# Altium footprint library 2.52-直插元件.PcbLib: 163 footprints (part 6 of 11)
Each footprint in its own frame and in the unit in brackets; x right, y up, seen from the top. Pads: shape width x height; smd on the part's side, far side on the other; paste and mask are expansions set on the pad; w line width, h text height; cw(c..) or ccw(c..) is an arc to the next point about the centre after c.
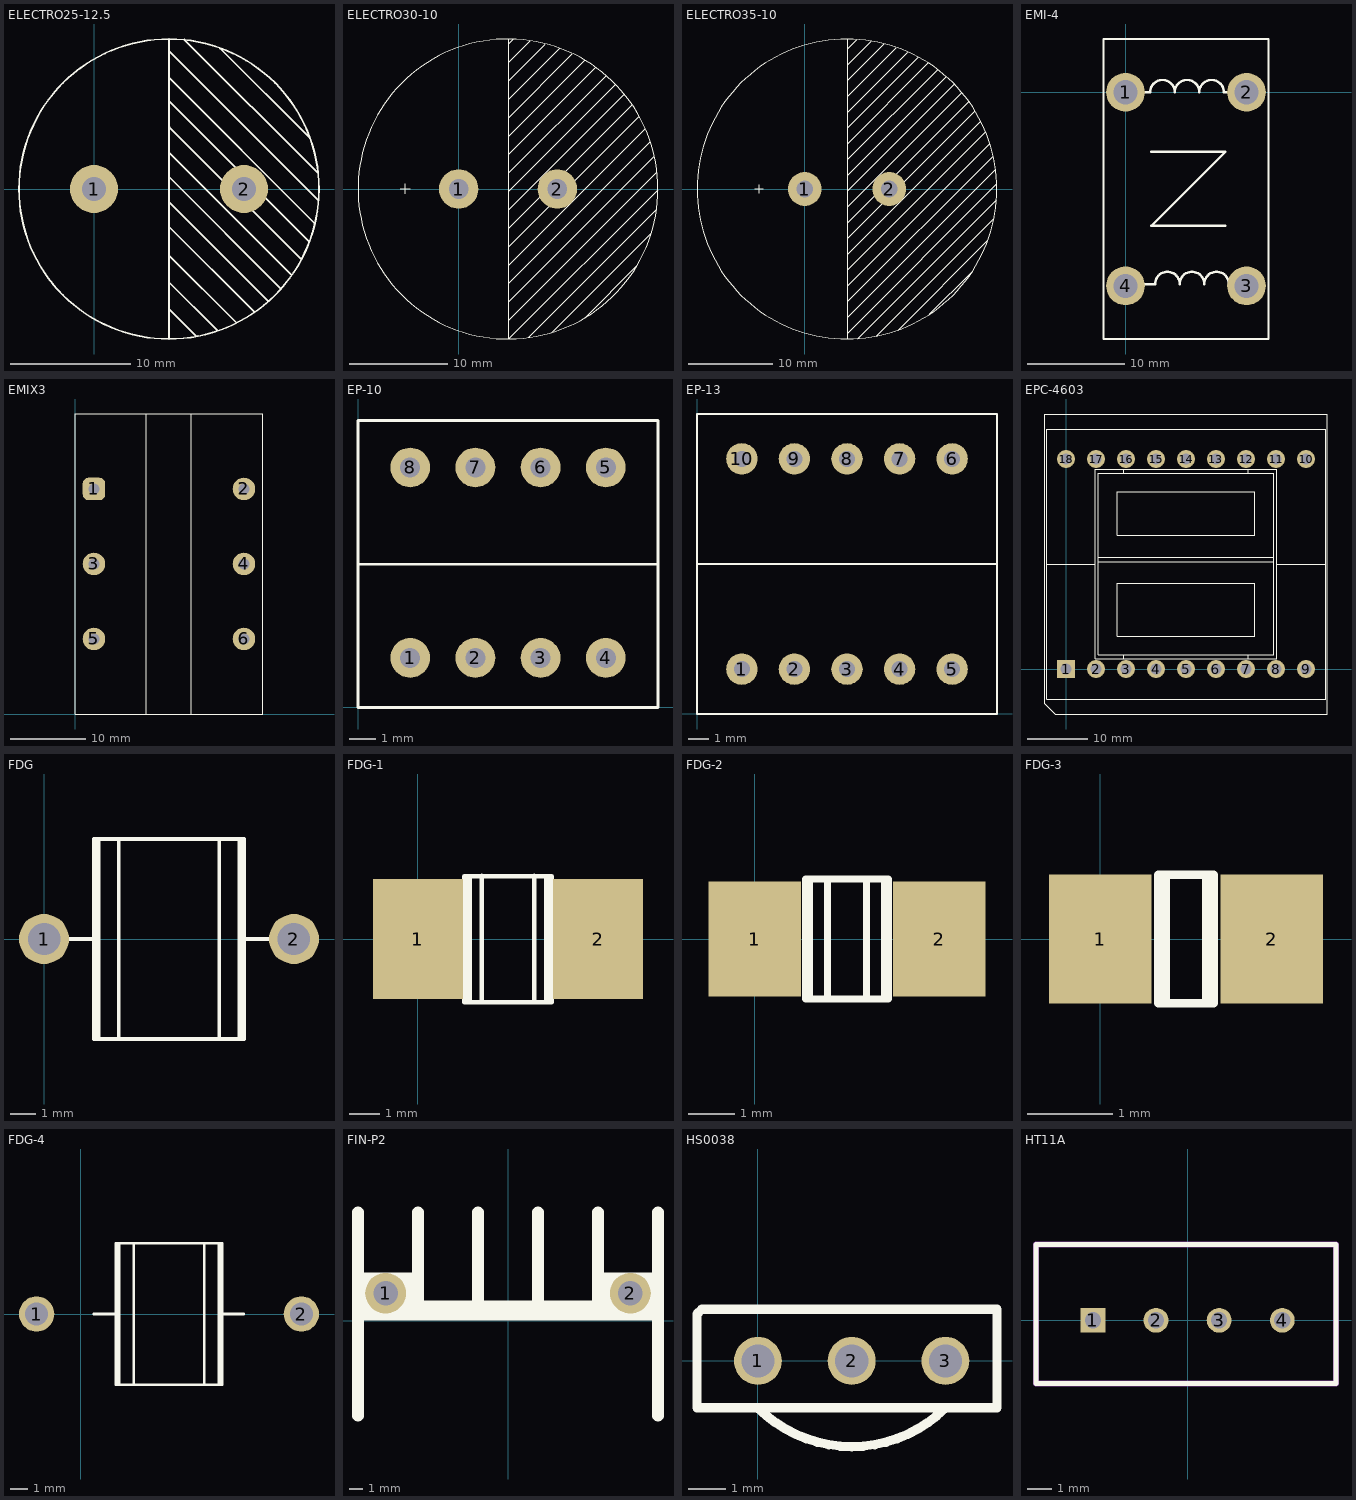
[diagram p5: the footprints below, top view; thin cyan lines are the x and y axes]

## ELECTRO25-12.5 [mm] "淘宝ID:黄晶宝石   店铺网址:https://shop463601444.taobao.com"
pads (2):
  round 4 hole 2: 1(0,0) 2(12.5,0)
Top Overlay:
  lines w0.15: 6.224,-1.075 14.513,-9.364 ; 6.236,-3.122 13.301,-10.187 ; 6.238,-7.75 10.3,-11.812 ; 6.25,-12.5 6.25,12.5 ; 6.25,1.01 15.556,-8.297 ; 6.256,7.302 17.939,-4.38 ; 6.26,9.255 18.387,-2.872 ; 6.263,11.487 18.7,-0.95 ; 6.266,-10.012 8.494,-12.241 ; 6.268,3.025 16.391,-7.097 ; 6.276,-5.555 11.831,-11.109 ; 6.284,5.161 17.241,-5.796 ; 7.531,12.453 18.678,1.306 ; 10.501,11.719 18.005,4.214 ; 18.75,-0.013 cw(c6.25,0) 18.75,0
3D body "User Library-Cap 25x50.STEP": height 50.05, standoff -18.95, extent -6.25,-12.5 18.75,12.5

## ELECTRO30-10 [mm]
pads (2):
  round 4 hole 2: 1(0,0) 2(10,0)
Top Overlay:
  circle w0.1: c5,0 r15.2
  lines w0.1: -5.909,0.011 -4.893,0.011 ; -5.401,-0.497 -5.401,0.519 ; 5.077,-15.2 5.077,15.2 ; 5.077,-15.178 20.201,-0.055 ; 5.077,-13.31 20.095,1.707 ; 5.077,-11.442 19.83,3.311 ; 5.077,-9.574 19.424,4.773 ; 5.077,-7.706 18.912,6.128 ; 5.077,-5.838 18.29,7.374 ; 5.077,-3.97 17.575,8.528 ; 5.077,-2.102 16.78,9.6 ; 5.077,-0.234 15.874,10.562 ; 5.077,1.634 14.94,11.496 ; 5.077,3.502 13.895,12.319 ; 5.077,5.37 12.759,13.051 ; 5.077,7.238 11.532,13.693 ; 5.077,9.106 10.22,14.249 ; 5.077,10.974 8.796,14.692 ; 5.077,12.842 7.254,15.019 ; 5.077,14.71 5.542,15.175 ; 7.097,-15.027 20.057,-2.066 ; 9.439,-14.552 19.532,-4.46 ; 12.832,-13.027 18.019,-7.841
3D body "User Library-Assy_CE_R400_D1200_H1450.STEP": height 36.83, standoff -6.89, extent -10.24,-15.237 20.24,15.237
3D body "User Library-Assy_CE_R400_D1200_H2000.STEP": height 50.8, standoff -6.89, extent -10.24,-15.239 20.24,15.239

## ELECTRO35-10 [mm]
pads (2):
  round 4 hole 2: 1(0,0) 2(10,0)
Top Overlay:
  circle w0.1: c5,0 r17.75
  lines w0.1: -5.909,0.011 -4.893,0.011 ; -5.401,-0.497 -5.401,0.519 ; 5.074,-17.049 22.744,0.62 ; 5.077,-17.75 5.077,17.75 ; 5.077,-15.178 22.589,2.334 ; 5.077,-13.31 22.287,3.899 ; 5.077,-11.442 21.897,5.377 ; 5.077,-9.574 21.41,6.759 ; 5.077,-7.706 20.819,8.036 ; 5.077,-5.838 20.144,9.229 ; 5.077,-3.97 19.394,10.346 ; 5.077,-2.102 18.58,11.4 ; 5.077,-0.234 17.695,12.384 ; 5.077,1.634 16.732,13.289 ; 5.077,3.502 15.712,14.136 ; 5.077,5.37 14.621,14.913 ; 5.077,7.238 13.444,15.605 ; 5.077,9.106 12.176,16.204 ; 5.077,10.974 10.822,16.719 ; 5.077,12.842 9.411,17.176 ; 5.077,14.71 7.88,17.513 ; 5.077,16.578 6.183,17.684 ; 6.291,-17.7 22.705,-1.286 ; 8.463,-17.396 22.404,-3.455 ; 11.041,-16.687 21.678,-6.049 ; 14.817,-14.779 19.768,-9.828
3D body "User Library-CE_Assy.STEP": height 31, standoff -6.82, extent -12.43,-17.451 22.43,17.451

## EMI-4 [mm]
pads (4):
  round 4 hole 2.5: 1(0,0) 2(12.5,0) 3(12.5,-20) 4(0,-20)
Top Overlay:
  lines w0.203: -2.261,-25.486 14.757,-25.486 14.757,5.502 -2.261,5.502 -2.261,-25.486
  lines w0.254: 0.208,0 2.548,0 cw(c3.818,0) 5.088,0 cw(c6.358,0) 7.628,0 cw(c8.898,0) 10.168,0 12.5,0 ; 0.716,-19.812 3.056,-19.812 cw(c4.326,-19.812) 5.596,-19.812 cw(c6.866,-19.812) 8.136,-19.812 cw(c9.406,-19.812) 10.676,-19.812 13.008,-19.812 ; 2.68,-6.164 10.3,-6.164 ; 9.284,-6.164 10.3,-6.164 ; 9.792,-6.164 10.3,-6.164 ; 10.3,-13.784 2.68,-13.784 10.3,-6.164
3D body "User Library-indutancia vac.STEP": height 36, standoff -5, extent -3.502,-24.492 15.998,4.508

## EMIX3 [mm]
pads (6):
  rrect50% 3x3 hole 1.5: 1(2.5,30)
  round 3 hole 1.5: 2(22.5,30) 3(2.5,20) 4(22.5,20) 5(2.5,10) 6(22.5,10)
Top Overlay:
  lines w0.15: 9.5,0 9.5,40 ; 15.5,0 15.5,40 ; 0,0 25,0 25,40 0,40 0,0
3D body "DL001.STEP": height 39.29, standoff -4, extent 0,0 25,40

## EP-10 [mil]
pads (8):
  round 60 hole 30: 1(78.74,74.8) 2(177.17,74.8) 3(275.59,74.8) 4(374.02,74.8) 5(374.02,362.2) 6(275.59,362.2) 7(177.17,362.2) 8(78.74,362.2)
Top Overlay:
  lines w3.94: 0,216.14 452.76,216.14 ; 0,0 452.76,0 452.76,433.07 0,433.07 0,0
3D body "ep10.STEP": height 441.63, standoff -160.73, extent 0,0 452.75,433.07

## EP-13 [mil] "淘宝ID:黄晶宝石   店铺网址:https://shop463601444.taobao.com"
pads (10):
  round 60 hole 30: 1(85.43,85.43) 2(185.43,85.43) 3(285.43,85.43) 4(385.43,85.43) 5(485.43,85.43) 6(485.43,485.43) 7(385.43,485.43) 8(285.43,485.43) 9(185.43,485.43) 10(85.43,485.43)
Top Overlay:
  lines w3.94: 0,285.43 570.87,285.43 ; 0,0 0,570.87 570.87,570.87 570.87,0 0,0
3D body "EP13.STEP": height 488.19, standoff -157.48, extent 29.49,29.49 541.38,541.38

## EPC-4603 [mm]
pads (18):
  rect 3x3 hole 1.8: 1(0,0)
  round 3 hole 1.8: 2(5,0) 3(10,0) 4(15,0) 5(20,0) 6(25,0) 7(30,0) 8(35,0) 9(40,0) 10(40,35) 11(35,35) 12(30,35) 13(25,35) 14(20,35) 15(15,35) 16(10,35) 17(5,35) 18(0,35)
Top Overlay:
  lines w0.1: 5.354,17.85 34.649,17.85 ; 5.354,18.65 34.649,18.65 ; 9.6,1.7 9.6,2.346 ; 9.6,32.654 9.6,33.3 ; 30.4,1.7 30.4,2.341 ; 30.4,32.659 30.4,33.3 ; -3.25,17.5 4.9,17.5 ; -3.25,17.5 -3.25,-5 43.25,-5 43.25,17.5 ; -3.25,17.5 -3.25,40 43.25,40 43.25,17.5 ; 4.9,17.5 4.9,1.7 35.1,1.7 35.1,17.5 ; 4.9,17.5 4.9,33.3 35.1,33.3 35.1,17.5 ; 35.1,17.5 43.25,17.5 ; -3.5,-5.819 -1.819,-7.5 43.5,-7.5 43.5,42.5 -3.5,42.5 -3.5,-5.819 ; 5.35,2.35 34.65,2.35 34.65,32.65 5.35,32.65 5.35,2.35 ; 8.5,5.5 31.5,5.5 31.5,14.25 8.5,14.25 8.5,5.5 ; 8.5,22.25 31.5,22.25 31.5,29.5 8.5,29.5 8.5,22.25
3D body "变?": height 29.5, standoff -5, extent -3.5,-7.5 43.5,42.5

## FDG [mm] "淘宝ID:黄晶宝石   店铺网址:https://shop463601444.taobao.com"
pads (2):
  round 2 hole 1.3: 1(0,0) 2(10,0)
Top Overlay:
  lines w0.15: 0.738,-0.004 2,-0.004 ; 2.1,-4 2.1,4 ; 2.187,-3.98 2.187,4 ; 2.994,-3.981 2.994,4 ; 7.006,-3.981 7.006,4 ; 7.813,-3.98 7.813,4 ; 7.9,-4 7.9,4 ; 8,0 9.233,-0.001 ; 2,-4 8,-4 8,4 2,4 2,-4
3D body "flg.STEP": height 10, standoff -2.22, extent -0.96,-4 10.96,4

## FDG-1 [mm]
pads (2):
  rect 3x4 smd: 1(0,0) 2(6,0)
Top Overlay:
  lines w0.15: 1.641,-2.101 1.641,2.099 ; 1.728,-2.101 1.728,2.099 ; 2.123,-2.098 2.123,2.102 ; 3.877,-2.098 3.877,2.102 ; 4.272,-2.101 4.272,2.099 ; 4.359,-2.101 4.359,2.099 ; 1.541,-2.101 1.541,2.099 4.459,2.099 4.459,-2.101 1.541,-2.101
3D body "User Library-ATC-c.step": height 6.39, standoff 0.01, extent 0.08,-2.1 5.92,2.1

## FDG-2 [mm]
pads (2):
  rect 2x2.5 smd: 1(0,0) 2(4,0)
Top Overlay:
  lines w0.15: 1.187,-1.3 1.187,1.3 ; 1.582,-1.3 1.582,1.3 ; 2.418,-1.3 2.418,1.3 ; 2.813,-1.3 2.813,1.3 ; 1.1,-1.3 1.1,1.3 2.9,1.3 2.9,-1.3 1.1,-1.3
3D body "User Library-ATC-b.step": height 2.81, standoff -0.01, extent 0.605,-1.291 3.395,1.309

## FDG-3 [mm]
pads (2):
  rect 1.2x1.5 smd: 1(0,0) 2(2,0)
Top Overlay:
  lines w0.1: 0.762,-0.75 0.762,0.75 ; 1.238,-0.75 1.238,0.75 ; 0.675,-0.75 1.325,-0.75 1.325,0.75 0.675,0.75 0.675,-0.75
3D body "User Library-ATC-a.step": height 1.42, standoff -0.01, extent 0.3,-0.73 1.7,0.73

## FDG-4 [mm]
pads (2):
  round 2 hole 1.3: 1(-2.5,0) 2(12.5,0)
Top Overlay:
  lines w0.15: 0.738,-0.004 2,-0.004 ; 2.1,-4 2.1,4 ; 2.187,-3.98 2.187,4 ; 2.994,-3.981 2.994,4 ; 7.006,-3.981 7.006,4 ; 7.813,-3.98 7.813,4 ; 7.9,-4 7.9,4 ; 8,0 9.233,-0.001 ; 2,-4 2,4 8,4 8,-4 2,-4
3D body "User Library-EC350X.step": height 8, standoff -1.74, extent -3,-4 13,4

## FIN-P2 [mm] "散热片"
height 1.9
pads (2):
  round 3 hole 1.8: 1(-9.017,2.032) 2(9.017,2.032)
Top Overlay:
  rectangle: -11.049,0.889 -6.629,3.556
  rectangle: 6.629,1.27 11.049,3.556
  lines w0.85: -11.049,-7 -11.049,8 ; -6.629,0.762 -6.629,8.001 ; -2.21,0.762 -2.21,8.001 ; 2.21,0.762 2.21,8.001 ; 6.629,0.762 6.629,8.001 ; 11.049,-7 11.049,8
  lines w1.5: -10.668,0.762 10.668,0.762

## HS0038 [mm]
pads (3):
  round 1.3 hole 0.9: 1(0,0) 2(2.54,0) 3(5.08,0)
Top Overlay:
  lines w0.254: 0,-1.27 ccw(c2.54,1.27) 5.08,-1.27 ; -1.651,-1.27 6.477,-1.27 6.477,1.397 -1.524,1.397 -1.651,1.27 -1.651,-1.27

## HT11A [mm]
pads (4):
  rect 1x1 hole 0.65: 1(-3.81,0)
  round 1 hole 0.65: 2(-1.27,0) 3(1.27,0) 4(3.81,0)
Top Overlay:
  lines w0.2: -6.096,-2.54 -6.096,3.048 5.969,3.048 5.969,-2.54 -6.096,-2.54
Mechanical 14:
  lines w0.254: -6.096,-2.54 -6.096,3.048 5.969,3.048 5.969,-2.54 -6.096,-2.54
3D body "DHT11.stp": height 15.7, standoff -3.3, extent -6,-2.496 6,3.004